# Altium integrated library Cap-El-SMD_V2.IntLib: 121 symbols (continued)
## 100uF-16V-20%-(6.3x5.4)
designator C?, comment value 100uF  Voltage: 16V  (hidden comment: 100uF-16V-20%-6.3x5.4)
Cap Electrolytic SMD (6.3x5.4); Manufacturer: Various; Part Number: Cap El SMD 100uF-16V-20%_6.3x5.4; Tol: 20%; Package: CAP-EL-SMD-6.3x5.4; EDM-PN: *; Text2: *; Text1: *; DCE Part No: *
footprint CAP-EL-SMD-6.3x5.4 (CAP El SMD 6.3x5.4mm)
pins: 1, 2

## 100uF-25V-20%-(6.3x7.7)
designator C?, comment value 100uF  Voltage: 25V  (hidden comment: 100uF-25V-20%_6.3x7.7)
Cap Electrolytic SMD (6.3 x 7.7); Manufacturer: Various; Part Number: 100uF-25V-20%-6.3x7.7; Tol: 20%; Package: CAP-EL-SMD-6.3x7.7; EDM-PN: *; Text2: *; Text1: *; DCE Part No: *
footprint CAP-EL-SMD-6.3X7.7 (CAP El SMD 6.3x7.7mm)
pins: 1, 2

## 100uF-35V-20%-(6.3x7.7)
designator C?, comment value 100uF  Voltage: 35V  (hidden comment: 100uF-35V-20%_6.3x7.7)
Cap Electrolytic SMD (6.3 x 7.7); Manufacturer: Various; Part Number: 100uF-35V-20%-6.3x7.7; EDM-PN: CAP292; Tol: 20%; Package: CAP-EL-SMD-6.3x7.7; Text2: *; Text1: *; DCE Part No: *
footprint CAP-EL-SMD-6.3X7.7 (CAP El SMD 6.3x7.7mm)
pins: 1, 2

## 100uF-35V-20%-EEE-FT1V101AP
designator C?, comment value 100uF  Voltage: 35V  (hidden comment: EEE-FT1V101AP)
Cap Electrolytic SMD; Manufacturer: Panasonic; Tol: 20%; Part Number: EEE-FT1V101AP; Package: CAP-EL-SMD-6.3x5.8; EDM-PN: *; Text2: *; Text1: *; DCE Part No: *
footprint CAP-EL-SMD-6.3x5.8 (CAP El SMD 6.3x5.4mm)
pins: 1, 2

## 100uF-35V-20%-EEVFC1V101P
designator C?, comment value 100uF  Voltage: 35V  (hidden comment: EEVFC1V101P)
Cap Electrolytic SMD Low Imp; Manufacturer: Panasonic; Tol: 20%; Part Number: EEVFC1V101P; Package: CAP-EL-SMD-10x10.5; EDM-PN: *; Text2: *; Text1: *; DCE Part No: *
footprint CAP-EL-SMD-10x10.5 (CAP El SMD 10.0x10.0mm)
pins: 1, 2

## 100uF-50V-20%-50LZ101MLC8×10.5EC
designator C?, comment value 100uF  Voltage: 50V  (hidden comment: 50LZ101MLC8×10.5EC)
Cap Electrolytic SMD Low Imp; Manufacturer: KJ Electronics; Tol: 20%; Part Number: 50LZ101MLC8×10.5EC; Package: CAP-EL-SMD-8x10.5; EDM-PN: *; Text2: *; Text1: *; DCE Part No: *
footprint CAP-EL-SMD-8x10.5 (CAP El SMD 8.0x10.5mm)
pins: 1, 2

## 100uF-50V-20%-EEEFK1H101P
designator C?, comment value 100uF  Voltage: 50V  (hidden comment: EEEFK1H101P)
Cap Electrolytic SMD (8x10.2); Manufacturer: Panasonic; Tol: 20%; Part Number: EEEFK1H101P; Package: CAP-El-SMD-8x10.5; EDM-PN: *; Text2: *; Text1: *; DCE Part No: *
footprint CAP-El-SMD-8x10.5 (CAP El SMD 8.0x10.5mm)
pins: 1, 2

## 100uF-63V-20%-AFK107M63G24T
designator C?, comment value 100uF  Voltage: 63V  (hidden comment: AFK107M63G24T)
Cap Electrolytic SMD Lowest ESR; Manufacturer: CDE; Tol: 20%; Part Number: AFK107M63G24T; Package: CAP-EL-SMD-10x10.5; EDM-PN: *; Text2: *; Text1: *; DCE Part No: *
footprint CAP-EL-SMD-10x10.5 (CAP El SMD 10.0x10.0mm)
pins: 1, 2

## 100uF-63V-20%-ECEV1JA101P
designator C?, comment value 100uF  Voltage: 63V  (hidden comment: ECEV1JA101P)
Cap Electrolytic SMD; Manufacturer: Panasonic; Tol: 20%; Part Number: ECEV1JA101P; Package: CAP-EL-SMD-10x10.5; EDM-PN: *; Text2: *; Text1: *; DCE Part No: *
footprint CAP-EL-SMD-10x10.5 (CAP El SMD 10.0x10.0mm)
pins: 1, 2

## 100uF-63V-20%-EEVTG1J101Q
designator C?, comment value 100uF  Voltage: 63V  (hidden comment: EEVTG1J101Q)
Cap Electrolytic SMD Low ESR; Manufacturer: Panasonic; Tol: 20%; Part Number: EEVTG1J101Q; Package: CAP-EL-SMD-15x13.5; EDM-PN: *; Text2: *; Text1: *; DCE Part No: *
footprint CAP-EL-SMD-15.0x13.5 (CAP El SMD 15.0x13.5mm)
pins: 1, 2

## 100uF-63V-20%-ELV100M63RC
designator C?, comment value 100uF  Voltage: 63V  (hidden comment: ELV100M63RC)
Cap Electrolytic SMD; Manufacturer: Hitano; Tol: 20%; Part Number: ELV100M63RC; Package: CAP-EL-SMD-10x10.5; EDM-PN: *; Text2: *; Text1: *; DCE Part No: *
footprint CAP-EL-SMD-10x10.5 (CAP El SMD 10.0x10.0mm)
pins: 1, 2

## 100uF-100V-20%-EEV-FK2A101M
designator C?, comment value 100uF  Voltage: 100V  (hidden comment: EEV-FK2A101M)
Cap Electrolytic SMD; Manufacturer: Panasonic; Tol: 20%; Part Number: EEV-FK2A101M; Package: CAP-EL-SMD-16x16.5; EDM-PN: *; Text2: *; Text1: *; DCE Part No: *
footprint CAP-EL-SMD-16x16.5 (CAP El SMD 16.0x16.5mm)
pins: 1, 2

## 100uF-100V-20%-EEVFK2A101M
designator C?, comment value 100uF  Voltage: 100V  (hidden comment: EEVFK2A101M)
Cap Electrolytic SMD (16x16.5); Manufacturer: Panasonic; Tol: 20%; Part Number: EEVFK2A101M; Package: CAP-EL-SMD-16x16.5; EDM-PN: *; Text2: *; Text1: *; DCE Part No: *
footprint CAP-EL-SMD-16x16.5 (CAP El SMD 16.0x16.5mm)
pins: 1, 2

## 120uF-6.3V-20%-APXE6R3ARA121ME61G
designator C?, comment value 120uF  Voltage: 6.3V  (hidden comment: APXE6R3ARA121ME61G)
Cap Electrolytic SMD; Manufacturer: Panasonic; Tol: 20%; Part Number: APXE6R3ARA121ME61G; Package: CAP-EL-SMD-5.0x5.8; EDM-PN: *; Text2: *; Text1: *; DCE Part No: *
footprint CAP-EL-SMD-6.3X7.7 (CAP El SMD 6.3x7.7mm)
pins: 1, 2

## 120uF-6.3V-20%-EEFCX0J121R
designator C?, comment value 120uF  Voltage: 6.3V  (hidden comment: EEFCX0J121R)
Cap Electrolytic SMD; Manufacturer: Panasonic; Tol: 20%; Part Number: EEFCX0J121R; Package: SP-CAP-CX; EDM-PN: *; Text2: *; Text1: *; DCE Part No: *
footprint SP-CAP-CX (Al Capacitor, 2-Leads, Body 7.3x4.3mm, IPC Medium Density)
pins: 1, 2

## 120uF-10V-20%-10SVPC120M
designator C?, comment value 120uF  Voltage: 10V  (hidden comment: 10SVPC120M)
Cap Electrolytic SMD; Manufacturer: Panasonic; Tol: 20%; Part Number: 10SVPC120M; Package: CAP-EL-SMD-6.3x5.8; EDM-PN: *; Text2: *; Text1: *; DCE Part No: *
footprint CAP-EL-SMD-6.3x5.8 (CAP El SMD 6.3x5.4mm)
pins: 1, 2

## 150uF-10V-20%-10LZ151MLC6.3×7.7EC
designator C?, comment value 150uF  Voltage: 10V  (hidden comment: 10LZ151MLC6.3×7.7EC)
Cap Electrolytic SMD Low Imp; Manufacturer: KJ Electronics; Tol: 20%; Part Number: 10LZ151MLC6.3×7.7EC; Package: CAP-EL-SMD-6.3x7.7; EDM-PN: *; Text2: *; Text1: *; DCE Part No: *
footprint CAP-EL-SMD-8x10.5 (CAP El SMD 8.0x10.5mm)
pins: 1, 2

## 220uF-6.3V-20%-ECEV0JA221WP
designator C?, comment value 220uF  Voltage: 6.3V  (hidden comment: ECEV0JA221WP)
Cap Electrolytic SMD; Manufacturer: Panasonic; EDM-PN: CAP764; Tol: 20%; Part Number: ECEV0JA221WP; Package: CAP-EL-SMD-6.3x5.4; Text2: *; Text1: *; DCE Part No: *
footprint CAP-EL-SMD-6.3x5.4 (CAP El SMD 6.3x5.4mm)
pins: 1, 2

## 220uF-16V-20%-(6.3x7.7)
designator C?, comment value 220uF  Voltage: 16V  (hidden comment: 220uF-16V-20%_6.3x7.7)
Cap Electrolytic SMD (6.3 x 7.7); Manufacturer: Various; Part Number: 220uF-16V-20%-6.3x7.7; Tol: 20%; Package: CAP-EL-SMD-6.3x7.7; EDM-PN: *; Text2: *; Text1: *; DCE Part No: *
footprint CAP-EL-SMD-6.3X7.7 (CAP El SMD 6.3x7.7mm)
pins: 1, 2

## 220uF-16V-20%-EEE-1CA221XP
designator C?, comment value 220uF  Voltage: 16V  (hidden comment: EEE-1CA221XP)
Cap Electrolytic SMD (6.3 x 7.7); Manufacturer: Panasonic; Tol: 20%; Part Number: EEE-1CA221XP; Package: CAP-EL-SMD-6.3x7.7; EDM-PN: *; Text2: *; Text1: *; DCE Part No: *
footprint CAP-EL-SMD-6.3X7.7 (CAP El SMD 6.3x7.7mm)
pins: 1, 2

## 220uF-16V-20%-EEE-HA1C221P
designator C?, comment value 220uF  Voltage: 16V  (hidden comment: EEE-HA1C221P)
Cap Electrolytic SMD (10x10.5) Low Imp; Manufacturer: Panasonic; Tol: 20%; Part Number: EEE-HA1C221P; Package: CAP-EL-SMD-10x10.5; EDM-PN: *; Text2: *; Text1: *; DCE Part No: *
footprint CAP-EL-SMD-10x10.5 (CAP El SMD 10.0x10.0mm)
pins: 1, 2

## 220uF-16V-20%-UWT1C221MCL1GS
designator C?, comment value 220uF  Voltage: 16V  (hidden comment: UWT1C221MCL1GS)
Cap Electrolytic SMD (6.3 x 7.7); Manufacturer: Nichicon; Tol: 20%; Part Number: UWT1C221MCL1GS; Package: CAP-EL-SMD-6.3X7.7; EDM-PN: *; Text2: *; Text1: *; DCE Part No: *
footprint CAP-EL-SMD-6.3X7.7 (CAP El SMD 6.3x7.7mm)
pins: 1, 2

## 220uF-25V-20%-(6.3x8.0)
designator C?, comment value 220uF  Voltage: 25V  (hidden comment: 220uF-25V-20%_6.3x8)
Cap Electrolytic SMD (6.3 x 8.0); Manufacturer: Various; Part Number: 220uF-25V-20%-6.3x8.0; Tol: 20%; Package: CAP-EL-SMD-6.3x7.7; EDM-PN: *; Text2: *; Text1: *; DCE Part No: *
footprint CAP-EL-SMD-6.3X7.7 (CAP El SMD 6.3x7.7mm)
pins: 1, 2

## 220uF-25V-20%-UWT1E221MNL1GS
designator C?, comment value 220uF  Voltage: 25V  (hidden comment: UWT1E221MNL1GS)
Cap Electrolytic SMD; Manufacturer: Nichicon; Tol: 20%; Part Number: UWT1E221MNL1GS; Package: CAP-EL-SMD-8x10.5; EDM-PN: *; Text2: *; Text1: *; DCE Part No: *
footprint CAP-EL-SMD-8x10.5 (CAP El SMD 8.0x10.5mm)
pins: 1, 2

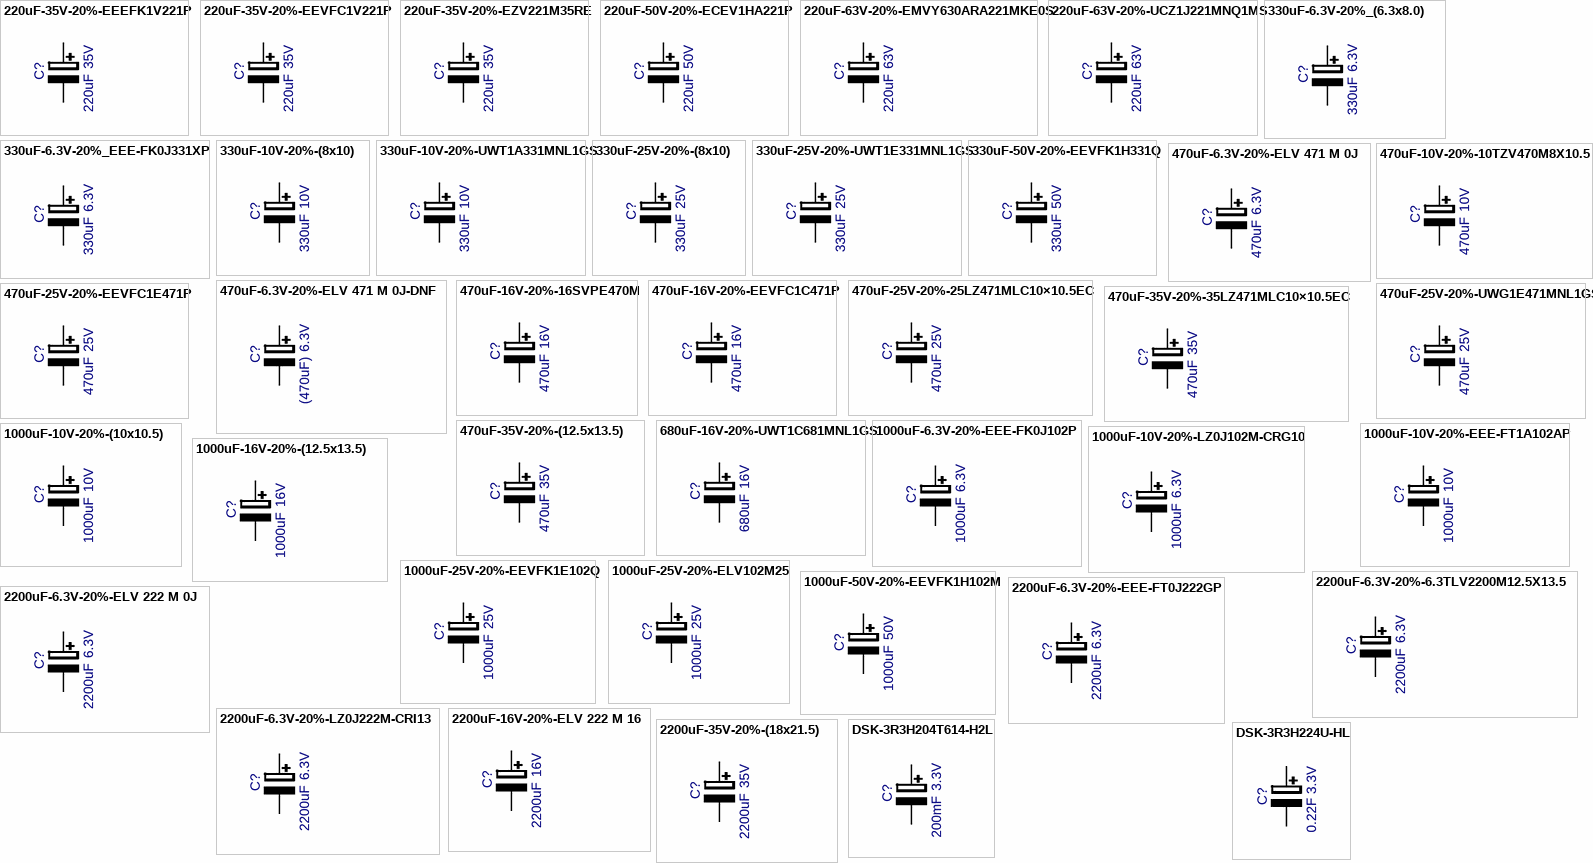
[diagram p2: symbols 220uF-35V-20%-EEEFK1V221P to DSK-3R3H224U-HL]

## 220uF-35V-20%-EEEFK1V221P
designator C?, comment value 220uF  Voltage: 35V  (hidden comment: EEEFK1V221P)
Cap Electrolytic SMD (8x10.2); Manufacturer: Panasonic; Tol: 20%; Part Number: EEEFK1V221P; Package: CAP-El-SMD-8x10.5; EDM-PN: *; Text2: *; Text1: *; DCE Part No: *
footprint CAP-El-SMD-8x10.5 (CAP El SMD 8.0x10.5mm)
pins: 1, 2

## 220uF-35V-20%-EEVFC1V221P
designator C?, comment value 220uF  Voltage: 35V  (hidden comment: EEVFC1V221P)
Cap Electrolytic SMD Low Imp; Manufacturer: Panasonic; EDM-PN: CAP277; Tol: 20%; Part Number: EEVFC1V221P; Package: CAP-EL-SMD-10x10.5; Text2: *; Text1: *; DCE Part No: *
footprint CAP-EL-SMD-10x10.5 (CAP El SMD 10.0x10.0mm)
pins: 1, 2

## 220uF-35V-20%-EZV221M35RE
designator C?, comment value 220uF  Voltage: 35V  (hidden comment: EZV221M35RE)
Cap Electrolytic SMD Low Imp; Manufacturer: Hitano; Tol: 20%; Part Number: EZV221M35RE; Package: CAP-El-SMD-8x10.5; EDM-PN: *; Text2: *; Text1: *; DCE Part No: *
footprint CAP-El-SMD-8x10.5 (CAP El SMD 8.0x10.5mm)
pins: 1, 2

## 220uF-50V-20%-ECEV1HA221P
designator C?, comment value 220uF  Voltage: 50V  (hidden comment: ECEV1HA221P)
Cap Electrolytic SMD; Manufacturer: Panasonic; Tol: 20%; Part Number: ECEV1HA221P; Package: CAP-EL-SMD-10x10.5; EDM-PN: *; Text2: *; Text1: *; DCE Part No: *
footprint CAP-EL-SMD-10x10.5 (CAP El SMD 10.0x10.0mm)
pins: 1, 2

## 220uF-63V-20%-EMVY630ARA221MKE0S
designator C?, comment value 220uF  Voltage: 63V  (hidden comment: EMVY630ARA221MKE0S)
Cap Electrolytic SMD; Manufacturer: United Chemi-Con; Tol: 20%; Part Number: EMVY630ARA221MKE0S; Package: CAP-EL-SMD-12.5x13.5; EDM-PN: *; Text2: *; Text1: *; DCE Part No: *
footprint CAP-EL-SMD-12.5x13.5 (CAP El SMD 12.5x13.5mm)
pins: 1, 2

## 220uF-63V-20%-UCZ1J221MNQ1MS
designator C?, comment value 220uF  Voltage: 63V  (hidden comment: UCZ1J221MNQ1MS)
Cap Electrolytic SMD Low Temperature ESR; Manufacturer: Nichicon; Tol: 20%; Part Number: UCZ1J221MNQ1MS; Package: CAP-EL-SMD-12.5x13.5; EDM-PN: *; Text2: *; Text1: *; DCE Part No: *
footprint CAP-EL-SMD-12.5x13.5 (CAP El SMD 12.5x13.5mm)
pins: 1, 2

## 330uF-6.3V-20%_(6.3x8.0)
designator C?, comment value 330uF  Voltage: 6.3V  (hidden comment: 330uF-6.3V-20%_6.3x8)
Cap Electrolytic SMD (6.3 x 8.0); Manufacturer: Various; Part Number: 330uF-6.3V-20%-6.3x8.0; Tol: 20%; Package: CAP-EL-SMD-6.3x7.7; EDM-PN: *; Text2: *; Text1: *; DCE Part No: *
footprint CAP-EL-SMD-6.3X7.7 (CAP El SMD 6.3x7.7mm)
pins: 1, 2

## 330uF-6.3V-20%_EEE-FK0J331XP
designator C?, comment value 330uF  Voltage: 6.3V  (hidden comment: EEE-FK0J331XP)
Cap Electrolytic SMD (6.3 x 8.0) EEE-FK; Manufacturer: Panasonic; Tol: 20%; Part Number: EEE-FK0J331XP; Package: CAP-EL-SMD-6.3x7.7; EDM-PN: *; Text2: *; Text1: *; DCE Part No: *
footprint CAP-EL-SMD-6.3X7.7 (CAP El SMD 6.3x7.7mm)
pins: 1, 2

## 330uF-10V-20%-(8x10)
designator C?, comment value 330uF  Voltage: 10V  (hidden comment: 330uF-10V-20%)
Cap Electrolytic SMD; Manufacturer: Various; Part Number: 330uF-10V-20%-8x10; Tol: 20%; Package: CAP-EL-SMD-8x10.5; EDM-PN: *; Text2: *; Text1: *; DCE Part No: *
footprint CAP-El-SMD-8x10.5 (CAP El SMD 8.0x10.5mm)
pins: 1, 2

## 330uF-10V-20%-UWT1A331MNL1GS
designator C?, comment value 330uF  Voltage: 10V  (hidden comment: UWT1A331MNL1GS)
Cap Electrolytic SMD; Manufacturer: Nichicon; Tol: 20%; Part Number: UWT1A331MNL1GS; Package: CAP-EL-SMD-8x10.5; EDM-PN: *; Text2: *; Text1: *; DCE Part No: *
footprint CAP-El-SMD-8x10.5 (CAP El SMD 8.0x10.5mm)
pins: 1, 2

## 330uF-25V-20%-(8x10)
designator C?, comment value 330uF  Voltage: 25V  (hidden comment: 330uF-25V-20%)
Cap Electrolytic SMD; Manufacturer: Various; Part Number: 330uF-25V-20%-8x10; Tol: 20%; Package: CAP-EL-SMD-8x10.5; EDM-PN: *; Text2: *; Text1: *; DCE Part No: *
footprint CAP-El-SMD-8x10.5 (CAP El SMD 8.0x10.5mm)
pins: 1, 2

## 330uF-25V-20%-UWT1E331MNL1GS
designator C?, comment value 330uF  Voltage: 25V  (hidden comment: UWT1E331MNL1GS)
Cap Electrolytic SMD; Manufacturer: Nichicon; Tol: 20%; Part Number: UWT1E331MNL1GS; Package: CAP-EL-SMD-8x10.5; EDM-PN: *; Text2: *; Text1: *; DCE Part No: *
footprint CAP-El-SMD-8x10.5 (CAP El SMD 8.0x10.5mm)
pins: 1, 2

## 330uF-50V-20%-EEVFK1H331Q
designator C?, comment value 330uF  Voltage: 50V  (hidden comment: EEVFK1H331Q)
Cap Electrolytic SMD (12.5x13.5); Manufacturer: Panasonic; Tol: 20%; Part Number: EEVFK1H331Q; Package: CAP-EL-SMD-12.5x13.5; EDM-PN: *; Text2: *; Text1: *; DCE Part No: *
footprint CAP-EL-SMD-12.5x13.5 (CAP El SMD 12.5x13.5mm)
pins: 1, 2

## 470uF-6.3V-20%-ELV 471 M 0J
designator C?, comment value 470uF  Voltage: 6.3V  (hidden comment: ELV 471 M 0J)
Cap Electrolytic SMD; Manufacturer: Hitano; Tol: 20%; Part Number: ELV 471 M 0J; Package: CAP-EL-SMD-8x10.5; EDM-PN: *; Text2: *; Text1: *; DCE Part No: *
footprint CAP-El-SMD-8x10.5 (CAP El SMD 8.0x10.5mm)
pins: 1, 2

## 470uF-6.3V-20%-ELV 471 M 0J-DNF
designator C?, comment value (470uF)  Voltage: 6.3V  (hidden comment: ELV 471 M 0J)
Cap Electrolytic SMD - Do not Fit; Manufacturer: Hitano; Part Number: DNF - ELV 471 M 0J; Tol: 20%; Package: CAP-EL-SMD-8x10.5; EDM-PN: *; Text2: *; Text1: *; DCE Part No: *
footprint CAP-El-SMD-8x10.5 (CAP El SMD 8.0x10.5mm)
pins: 1, 2

## 470uF-10V-20%-10TZV470M8X10.5
designator C?, comment value 470uF  Voltage: 10V  (hidden comment: 10TZV470M8X10.5)
Cap Electrolytic Low Impedance; Manufacturer: Rybycon; Tol: 20%; Part Number: 10TZV470M8X10.5; Package: CAP-EL-SMD-8x10.5; EDM-PN: *; Text2: *; Text1: *; DCE Part No: *
footprint CAP-El-SMD-8x10.5 (CAP El SMD 8.0x10.5mm)
pins: 1, 2

## 470uF-16V-20%-16SVPE470M
designator C?, comment value 470uF  Voltage: 16V  (hidden comment: 16SVPE470M)
Cap Electrolytic SMD Low ESR; Manufacturer: Panasonic; Tol: 20%; Part Number: 16SVPE470M; Package: CAP-EL-SMD-10x12.5; EDM-PN: *; Text2: *; Text1: *; DCE Part No: *
footprint CAP-EL-SMD-10x12.5 (CAP El SMD 10.0x12.0mm)
pins: 1, 2

## 470uF-16V-20%-EEVFC1C471P
designator C?, comment value 470uF  Voltage: 16V  (hidden comment: EEVFC1C471P)
Cap Electrolytic SMD Low Imp; Manufacturer: Panasonic; EDM-PN: CAP386; Tol: 20%; Part Number: EEVFC1C471P; Package: CAP-EL-SMD-10x10.5; Text2: *; Text1: *; DCE Part No: *
footprint CAP-EL-SMD-10x10.5 (CAP El SMD 10.0x10.0mm)
pins: 1, 2

## 470uF-25V-20%-25LZ471MLC10×10.5EC
designator C?, comment value 470uF  Voltage: 25V  (hidden comment: 25LZ471MLC10×10.5EC)
Cap Electrolytic SMD Low Imp; Manufacturer: KJ Electronics; Tol: 20%; Part Number: 25LZ471MLC10×10.5EC; Package: CAP-EL-SMD-10x10.5; EDM-PN: *; Text2: *; Text1: *; DCE Part No: *
footprint CAP-EL-SMD-10x10.5 (CAP El SMD 10.0x10.0mm)
pins: 1, 2

## 470uF-25V-20%-EEVFC1E471P
designator C?, comment value 470uF  Voltage: 25V  (hidden comment: EEVFC1E471P)
Cap Electrolytic SMD Low Imp; Manufacturer: Panasonic; Tol: 20%; Part Number: EEVFC1E471P; Package: CAP-EL-SMD-10x10.5; EDM-PN: *; Text2: *; Text1: *; DCE Part No: *
footprint CAP-EL-SMD-10x10.5 (CAP El SMD 10.0x10.0mm)
pins: 1, 2

## 470uF-25V-20%-UWG1E471MNL1GS
designator C?, comment value 470uF  Voltage: 25V  (hidden comment: UWG1E471MNL1GS)
Cap Electrolytic SMD Low Imp; Manufacturer: Nichicon; EDM-PN: CAP646; Tol: 20%; Part Number: UWG1E471MNL1GS; Package: CAP-EL-SMD-10x10.5; Text2: *; Text1: *; DCE Part No: *
footprint CAP-EL-SMD-10x10.5 (CAP El SMD 10.0x10.0mm)
pins: 1, 2

## 470uF-35V-20%-35LZ471MLC10×10.5EC
designator C?, comment value 470uF  Voltage: 35V  (hidden comment: 35LZ471MLC10×10.5EC)
Cap Electrolytic SMD Low Imp; Manufacturer: KJ Electronics; Tol: 20%; Part Number: 35LZ471MLC10×10.5EC; Package: CAP-EL-SMD-10x10.5; EDM-PN: *; Text2: *; Text1: *; DCE Part No: *
footprint CAP-EL-SMD-10x10.5 (CAP El SMD 10.0x10.0mm)
pins: 1, 2

## 470uF-35V-20%-(12.5x13.5)
designator C?, comment value 470uF  Voltage: 35V  (hidden comment: 470uF-35V-20%--(12.5x13.5))
Cap Electrolytic SMD; Manufacturer: Variuos; Part Number: Cap El SMD 470uF-35V-20%-12.5x13.5; Tol: 20%; Package: CAP-EL-SMD-12.5x13.5; EDM-PN: *; Text2: *; Text1: *; DCE Part No: *
footprint CAP-EL-SMD-12.5x13.5 (CAP El SMD 12.5x13.5mm)
pins: 1, 2

## 680uF-16V-20%-UWT1C681MNL1GS
designator C?, comment value 680uF  Voltage: 16V  (hidden comment: UWT1C681MNL1GS)
Cap Electrolytic SMD (10x10.5); Manufacturer: Nichicon; Tol: 20%; Part Number: UWT1C681MNL1GS; Package: CAP-EL-SMD-10x10.5; EDM-PN: *; Text2: *; Text1: *; DCE Part No: *
footprint CAP-EL-SMD-10x10.5 (CAP El SMD 10.0x10.0mm)
pins: 1, 2

## 1000uF-6.3V-20%-EEE-FK0J102P
designator C?  value 1000uF  Voltage: 6.3V  (hidden comment: 1000uF-6.3V-20%-EEE-FK0J102P)
Cap Electrolytic SMD (8x10.5); Manufacturer: Panasonic; Tol: 20%; Part Number: EEE-FK0J102P; Package: CAP-EL-SMD-8x10.5; EDM-PN: *; Text2: *; Text1: *; DCE Part No: *
footprint CAP-El-SMD-8x10.5 (CAP El SMD 8.0x10.5mm)
pins: 1, 2

## 1000uF-10V-20%-(10x10.5)
designator C?, comment value 1000uF  Voltage: 10V  (hidden comment: 1000uF-10V-20%-10x10.5)
Cap Electrolytic SMD (10x10.5); Manufacturer: Various; Part Number: Cap El SMD 1000uF-10V-20%-10x10.5; Tol: 20%; Package: CAP-EL-SMD-10x10.5; EDM-PN: *; Text2: *; Text1: *; DCE Part No: *
footprint CAP-EL-SMD-10x10.5 (CAP El SMD 10.0x10.0mm)
pins: 1, 2

## 1000uF-10V-20%-EEE-FT1A102AP
designator C?  value 1000uF  Voltage: 10V  (hidden comment: 1000uF-10V-20%-EEE-FT1A102AP)
Cap Electrolytic SMD (8x10.5); Manufacturer: Panasonic; Tol: 20%; Part Number: EEE-FT1A102AP; Package: CAP-EL-SMD-8x10.5; EDM-PN: *; Text2: *; Text1: *; DCE Part No: *
footprint CAP-El-SMD-8x10.5 (CAP El SMD 8.0x10.5mm)
pins: 1, 2

## 1000uF-10V-20%-LZ0J102M-CRG10
designator C?, comment value 1000uF  Voltage: 6.3V  (hidden comment: LZ0J102M-CRG10)
Cap Electrolytic SMD (10x10.5); Manufacturer: Fujicon; Tol: 20%; Part Number: LZ0J102M-CRG10; Package: CAP-EL-SMD-10x10.5; EDM-PN: *; Text2: *; Text1: *; DCE Part No: *
footprint CAP-EL-SMD-10x10.5 (CAP El SMD 10.0x10.0mm)
pins: 1, 2

## 1000uF-16V-20%-(12.5x13.5)
designator C?, comment value 1000uF  Voltage: 16V  (hidden comment: 1000uF-16V-20%-12.5x13.5)
Cap Electrolytic SMD (12.5x13.5); Manufacturer: Various; Part Number: Cap El SMD 1000uF 16V 20% 12.5x13.5; Tol: 20%; Package: CAP-EL-SMD-12.5x13.5; EDM-PN: *; Text2: *; Text1: *; DCE Part No: *
footprint CAP-EL-SMD-12.5x13.5 (CAP El SMD 12.5x13.5mm)
pins: 1, 2

## 1000uF-25V-20%-EEVFK1E102Q
designator C?, comment value 1000uF  Voltage: 25V  (hidden comment: EEVFK1E102Q)
Cap Electrolytic SMD; Manufacturer: Panasonic; Tol: 20%; Part Number: EEVFK1E102Q; Package: CAP-EL-SMD-12.5x13.5; EDM-PN: *; Text2: *; Text1: *; DCE Part No: *
footprint CAP-EL-SMD-12.5x13.5 (CAP El SMD 12.5x13.5mm)
pins: 1, 2

## 1000uF-25V-20%-ELV102M25
designator C?, comment value 1000uF  Voltage: 25V  (hidden comment: ELV102M25)
Cap Electrolytic SMD; Manufacturer: Hitano; Tol: 20%; Part Number: ELV102M25; Package: CAP-EL-SMD-12.5x13.5; EDM-PN: *; Text2: *; Text1: *; DCE Part No: *
footprint CAP-EL-SMD-12.5x13.5 (CAP El SMD 12.5x13.5mm)
pins: 1, 2

## 1000uF-50V-20%-EEVFK1H102M
designator C?, comment value 1000uF  Voltage: 50V  (hidden comment: EEVFK1H102M)
Cap Electrolytic SMD; Manufacturer: Panasonic; Tol: 20%; Part Number: EEVFK1H102M; Package: CAP-EL-SMD-16x16.5; EDM-PN: *; Text2: *; Text1: *; DCE Part No: *
footprint CAP-EL-SMD-16x16.5 (CAP El SMD 16.0x16.5mm)
pins: 1, 2

## 2200uF-6.3V-20%-6.3TLV2200M12.5X13.5
designator C?, comment value 2200uF  Voltage: 6.3V  (hidden comment: 6.3TLV2200M12.5X13.5)
Cap Electrolytic SMD; Manufacturer: Rybycon; Tol: 20%; Part Number: 6.3TLV2200M12.5X13.5; Package: CAP-EL-SMD-12.5x13.5; EDM-PN: *; Text2: *; Text1: *; DCE Part No: *
footprint CAP-EL-SMD-12.5x13.5 (CAP El SMD 12.5x13.5mm)
pins: 1, 2

## 2200uF-6.3V-20%-EEE-FT0J222GP
designator C?, comment value 2200uF  Voltage: 6.3V  (hidden comment: EEE-FT0J222GP)
Cap Electrolytic SMD (10x10.5); Manufacturer: Panasonic; EDM-PN: CAP1243; Tol: 20%; Part Number: EEE-FT0J222GP; Package: CAP-EL-SMD-10x10.5; Text2: *; Text1: *; DCE Part No: *
footprint CAP-EL-SMD-10x10.5 (CAP El SMD 10.0x10.0mm)
pins: 1, 2

## 2200uF-6.3V-20%-ELV 222 M 0J
designator C?, comment value 2200uF  Voltage: 6.3V  (hidden comment: ELV 222 M 0J)
Cap Electrolytic SMD; Manufacturer: Hitano; Tol: 20%; Part Number: ELV 222 M 0J; Package: CAP-EL-SMD-12.5x13.5; EDM-PN: *; Text2: *; Text1: *; DCE Part No: *
footprint CAP-EL-SMD-12.5x13.5 (CAP El SMD 12.5x13.5mm)
pins: 1, 2

## 2200uF-6.3V-20%-LZ0J222M-CRI13
designator C?, comment value 2200uF  Voltage: 6.3V  (hidden comment: LZ0J222M-CRI13)
Cap Electrolytic SMD - Low ESR; Manufacturer: Fujicon; Tol: 20%; Part Number: LZ0J222M-CRI13; Package: CAP-EL-SMD-12.5x13.5; EDM-PN: *; Text2: *; Text1: *; DCE Part No: *
footprint CAP-EL-SMD-12.5x13.5 (CAP El SMD 12.5x13.5mm)
pins: 1, 2

## 2200uF-16V-20%-ELV 222 M 16
designator C?, comment value 2200uF  Voltage: 16V  (hidden comment: ELV 222 M 16)
Cap Electrolytic SMD; Manufacturer: Hitano; Tol: 20%; Part Number: ELV 222 M 16; Package: CAP-EL-SMD-16x16.5; EDM-PN: *; Text2: *; Text1: *; DCE Part No: *
footprint CAP-EL-SMD-16x16.5 (CAP El SMD 16.0x16.5mm)
pins: 1, 2

## 2200uF-35V-20%-(18x21.5)
designator C?, comment value 2200uF  Voltage: 35V  (hidden comment: 2200uF-35V-20%)
Cap Electrolytic SMD (18x21.5); Manufacturer: Various; Part Number: Cap El SMD 2200uF-35V-20%_18x21.5; Tol: 20%; Package: CAP-EL-SMD-18x21.5; EDM-PN: *; Text2: *; Text1: *; DCE Part No: *
footprint CAP-EL-SMD-18x21.5 (CAP-EL-SMD 18x21.5mm)
pins: 1, 2

## DSK-3R3H204T614-H2L
designator C?  value 200mF  Voltage: 3.3V  (hidden comment: DSK-3R3H204T614-H2L)
Cap Supercap 3.3V 200mF; Manufacturer: Elna; Tol: 20-80%; Part Number: DSK-3R3H204T614-H2L; Package: CAP-DSK-H2; EDM-PN: *; Text2: *; Text1: *; DCE Part No: *
footprint CAP-DSK-H2 (DSK-H2 11.7x6.8mm)
pins: 1, 2

## DSK-3R3H224U-HL
designator C?  value 0.22F  Voltage: 3.3V  (hidden comment: DSK-3R3H224U-HL)
Cap Supercap 3.3V 0.22F; Manufacturer: Elna; Tol: -20+80%; Part Number: DSK-3R3H224U-HL; Package: SuperCap-6.8-H; EDM-PN: *; Text2: *; Text1: *; DCE Part No: *
footprint SuperCap-6.8-H (SuperCap 6.8mm dia Shape-H)
pins: 1, 2

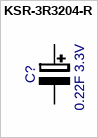
[diagram p3: symbol KSR-3R3204-R]

## KSR-3R3204-R
designator C?  value 0.22F  Voltage: 3.3V  (hidden comment: KSR-3R3204-R)
Cap Supercap 3.3V 0.22F; Manufacturer: Bussmann; Tol: -20+80%; Part Number: KSR-3R3204-R; Package: SuperCap-6.8-KSR; EDM-PN: *; Text2: *; Text1: *; DCE Part No: *
footprint SuperCap-6.8-KSR (SuperCap 6.8mm dia Shape-KSR)
pins: 1, 2